# Altium footprint library BASIC.PcbLib: 244 footprints (part 3 of 16)
Each footprint in its own frame and in the unit in brackets; x right, y up, seen from the top. Pads: shape width x height; smd on the part's side, far side on the other; paste and mask are expansions set on the pad; w line width, h text height; cw(c..) or ccw(c..) is an arc to the next point about the centre after c.
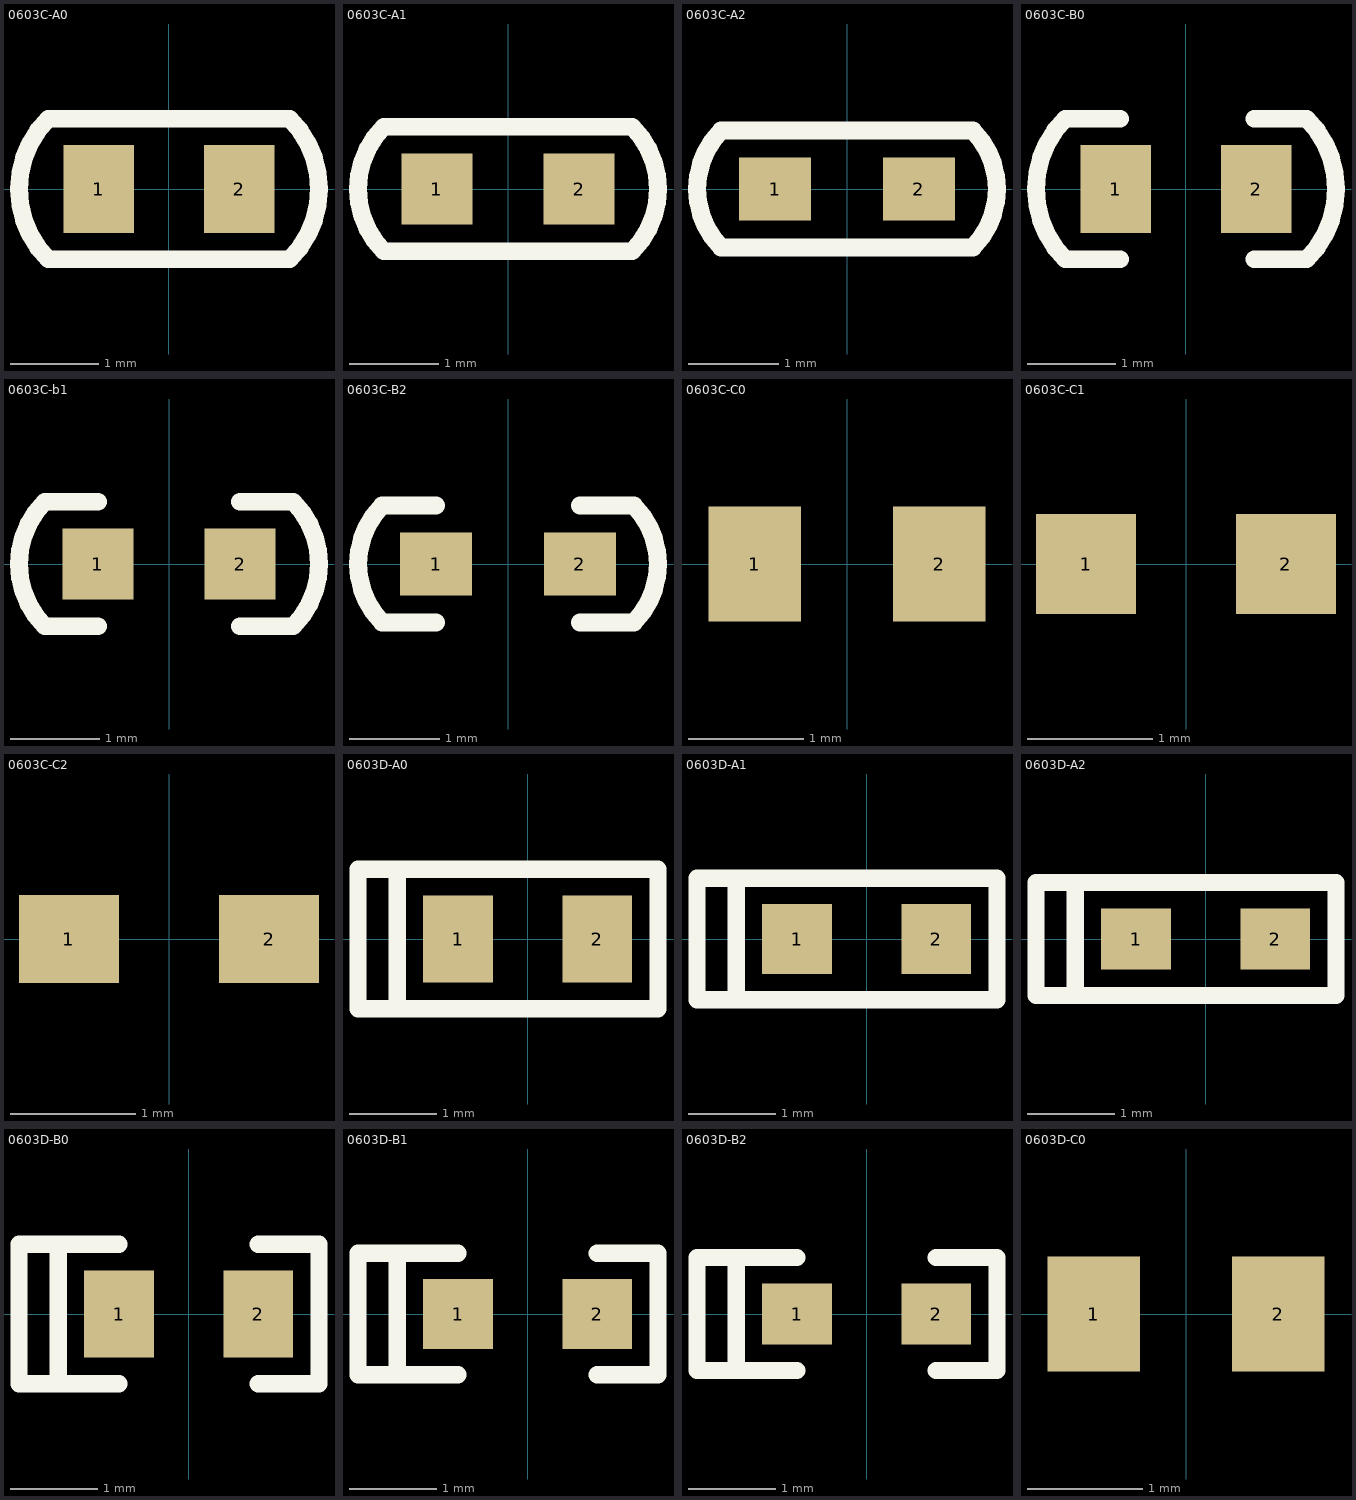
[diagram p2: the footprints below, top view; thin cyan lines are the x and y axes]

## 0603C-A0 [mm]
pads (2):
  rect 0.8x1 smd: 1(-0.8,0) 2(0.8,0)
Top Overlay:
  lines w0.2: -1.375,-0.8 cw(c-0.575,0) -1.375,0.8 1.375,0.8 cw(c0.575,0) 1.375,-0.8 -1.375,-0.8
3D body "CAP0603-2.step": height 0.8, standoff 0, extent -0.799,-0.399 0.801,0.401

## 0603C-A1 [mm]
pads (2):
  rect 0.8x0.8 smd: 1(-0.8,0) 2(0.8,0)
Top Overlay:
  lines w0.2: -1.4,-0.7 cw(c-0.7,0) -1.4,0.7 1.4,0.7 cw(c0.7,0) 1.4,-0.7 -1.4,-0.7
3D body "CAP0603-2.step": height 0.8, standoff 0, extent -0.799,-0.399 0.801,0.401

## 0603C-A2 [mm]
pads (2):
  rect 0.8x0.7 smd: 1(-0.8,0) 2(0.8,0)
Top Overlay:
  lines w0.2: -1.4,-0.65 cw(c-0.75,0) -1.4,0.65 1.4,0.65 cw(c0.75,0) 1.4,-0.65 -1.4,-0.65
3D body "CAP0603-2.step": height 0.8, standoff 0, extent -0.799,-0.399 0.801,0.401

## 0603C-B0 [mm]
pads (2):
  rect 0.8x1 smd: 1(-0.8,0) 2(0.8,0)
Top Overlay:
  lines w0.2: -1.375,-0.8 cw(c-0.575,0) -1.375,0.8 ; -1.35,-0.8 -0.75,-0.8 ; -1.35,0.8 -0.75,0.8 ; 0.775,-0.8 1.375,-0.8 ccw(c0.575,0) 1.375,0.8 0.775,0.8
3D body "CAP0603-2.step": height 0.8, standoff 0, extent -0.799,-0.399 0.801,0.401

## 0603C-b1 [mm]
pads (2):
  rect 0.8x0.8 smd: 1(-0.8,0) 2(0.8,0)
Top Overlay:
  lines w0.2: -0.8,-0.7 -1.4,-0.7 cw(c-0.7,0) -1.4,0.7 -0.8,0.7 ; 0.8,-0.7 1.4,-0.7 ccw(c0.7,0) 1.4,0.7 0.8,0.7
3D body "CAP0603-2.step": height 0.8, standoff 0, extent -0.799,-0.399 0.801,0.401

## 0603C-B2 [mm]
pads (2):
  rect 0.8x0.7 smd: 1(-0.8,0) 2(0.8,0)
Top Overlay:
  lines w0.2: -0.8,-0.65 -1.4,-0.65 cw(c-0.75,0) -1.4,0.65 -0.8,0.65 ; 0.8,-0.65 1.4,-0.65 ccw(c0.75,0) 1.4,0.65 0.8,0.65
3D body "CAP0603-2.step": height 0.8, standoff 0, extent -0.799,-0.399 0.801,0.401

## 0603C-C0 [mm]
pads (2):
  rect 0.8x1 smd: 1(-0.8,0) 2(0.8,0)
3D body "CAP0603-2.step": height 0.8, standoff 0, extent -0.799,-0.399 0.801,0.401

## 0603C-C1 [mm]
pads (2):
  rect 0.8x0.8 smd: 1(-0.8,0) 2(0.8,0)
3D body "CAP0603-2.step": height 0.8, standoff 0, extent -0.799,-0.399 0.801,0.401

## 0603C-C2 [mm]
pads (2):
  rect 0.8x0.7 smd: 1(-0.8,0) 2(0.8,0)
3D body "CAP0603-2.step": height 0.8, standoff 0, extent -0.799,-0.399 0.801,0.401

## 0603D-A0 [mm]
height 0.6
pads (2):
  rect 0.8x1 smd: 1(-0.8,0) 2(0.8,0)
Top Overlay:
  lines w0.2: -1.5,-0.8 1.5,-0.8 1.5,0.8 -1.5,0.8 ; -1.5,-0.8 -1.95,-0.8 -1.95,0.8 -1.5,0.8 ; -1.5,-0.8 -1.5,0.8
3D body "RES0603-3.step": height 0.45, standoff 0, extent -0.8,-0.4 0.8,0.4

## 0603D-A1 [mm]
height 0.6
pads (2):
  rect 0.8x0.8 smd: 1(-0.8,0) 2(0.8,0)
Top Overlay:
  lines w0.2: -1.5,-0.7 -1.95,-0.7 -1.95,0.7 -1.5,0.7 ; -1.5,-0.7 1.5,-0.7 1.5,0.7 -1.5,0.7 ; -1.5,-0.7 -1.5,0.7
3D body "RES0603-3.step": height 0.45, standoff 0, extent -0.8,-0.4 0.8,0.4

## 0603D-A2 [mm]
height 0.6
pads (2):
  rect 0.8x0.7 smd: 1(-0.8,0) 2(0.8,0)
Top Overlay:
  lines w0.2: -1.5,-0.65 -1.95,-0.65 -1.95,0.65 -1.5,0.65 ; -1.5,-0.65 -1.5,0.65 ; -1.5,-0.65 1.5,-0.65 1.5,0.65 -1.5,0.65
3D body "RES0603-3.step": height 0.45, standoff 0, extent -0.8,-0.4 0.8,0.4

## 0603D-B0 [mm]
height 0.6
pads (2):
  rect 0.8x1 smd: 1(-0.8,0) 2(0.8,0)
Top Overlay:
  lines w0.2: -0.8,-0.8 -1.5,-0.8 ; -0.8,0.8 -1.5,0.8 ; 0.8,-0.8 1.5,-0.8 1.5,0.8 0.8,0.8 ; -1.5,-0.8 -1.95,-0.8 -1.95,0.8 -1.5,0.8 ; -1.5,-0.8 -1.5,0.8
3D body "RES0603-3.step": height 0.45, standoff 0, extent -0.8,-0.4 0.8,0.4

## 0603D-B1 [mm]
height 0.6
pads (2):
  rect 0.8x0.8 smd: 1(-0.8,0) 2(0.8,0)
Top Overlay:
  lines w0.2: -0.8,-0.7 -1.5,-0.7 ; -0.8,0.7 -1.5,0.7 ; 0.8,-0.7 1.5,-0.7 1.5,0.7 0.8,0.7 ; -1.5,-0.7 -1.5,0.7 ; -1.5,-0.7 -1.95,-0.7 -1.95,0.7 -1.5,0.7
3D body "RES0603-3.step": height 0.45, standoff 0, extent -0.8,-0.4 0.8,0.4

## 0603D-B2 [mm]
height 0.6
pads (2):
  rect 0.8x0.7 smd: 1(-0.8,0) 2(0.8,0)
Top Overlay:
  lines w0.2: -0.8,-0.65 -1.5,-0.65 ; -0.8,0.65 -1.5,0.65 ; 0.8,-0.65 1.5,-0.65 1.5,0.65 0.8,0.65 ; -1.5,-0.65 -1.5,0.65 ; -1.5,-0.65 -1.95,-0.65 -1.95,0.65 -1.5,0.65
3D body "RES0603-3.step": height 0.45, standoff 0, extent -0.8,-0.4 0.8,0.4

## 0603D-C0 [mm]
height 0.6
pads (2):
  rect 0.8x1 smd: 1(-0.8,0) 2(0.8,0)
3D body "RES0603-3.step": height 0.45, standoff 0, extent -0.8,-0.4 0.8,0.4